# Altium footprint library main.PcbLib: 208 footprints (part 3 of 13)
Each footprint in its own frame and in the unit in brackets; x right, y up, seen from the top. Pads: shape width x height; smd on the part's side, far side on the other; paste and mask are expansions set on the pad; w line width, h text height; cw(c..) or ccw(c..) is an arc to the next point about the centre after c.
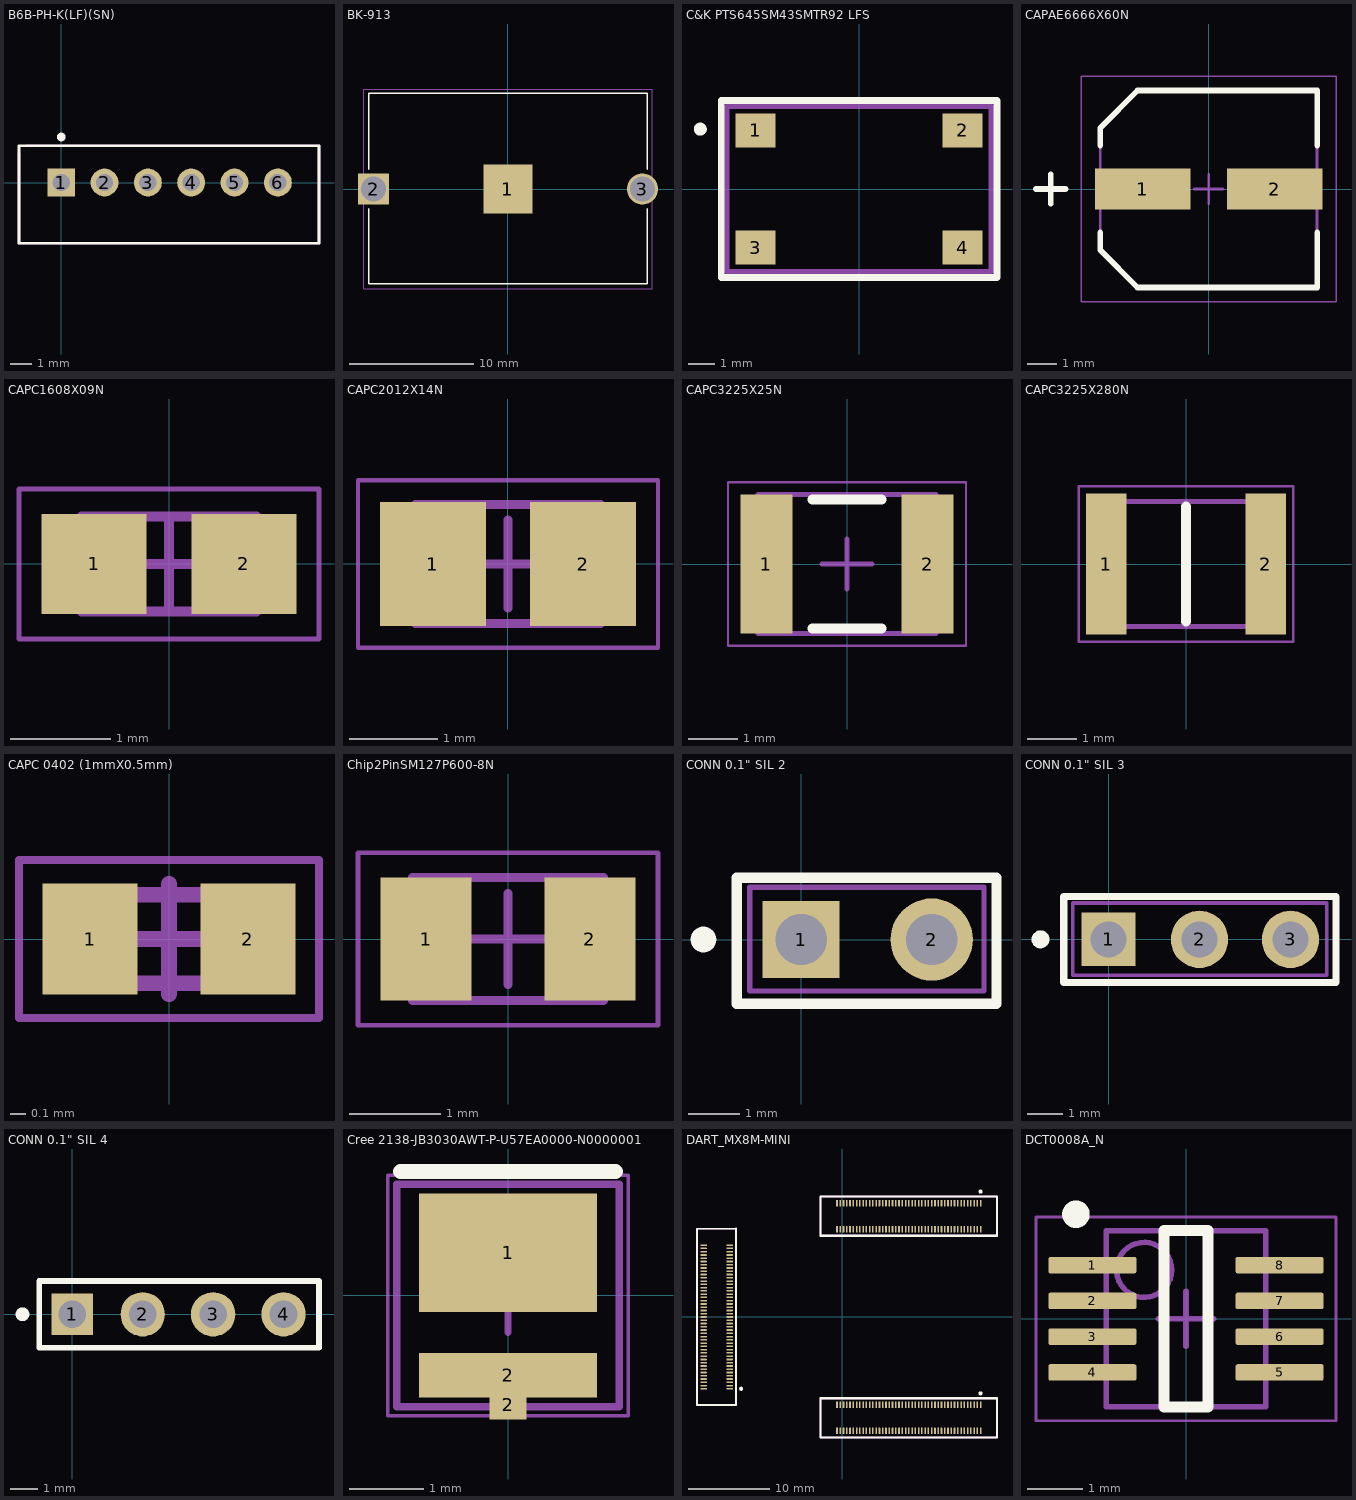
[diagram p2: the footprints below, top view; thin cyan lines are the x and y axes]

## B6B-PH-K(LF)(SN) [mm] "B6B-PH-K(LF)(SN)"
height 1.8
pads (6):
  rect 1.29x1.29 hole 0.8: 1(0,0)
  round 1.29 hole 0.8: 2(2,0) 3(4,0) 4(6,0) 5(8,0) 6(10,0)
Top Overlay:
  circle w0.2: c0,2.1 r0.1
  lines w0.127: -1.95,-2.8 -1.95,1.7 11.9,1.7 11.9,-2.8 -1.95,-2.8
Mechanical 7:
  text ".Designator" at -1.2,-3.9 h1.52
Mechanical 15:
  lines w0.127: -1.95,1.35 -1.95,-2.8 11.9,-2.8 11.9,1.25 ; -1.6,1.7 11.9,1.7 11.9,0
3D body "B6B-PH-K-S.STEP": height 6, standoff -3.4, extent -1.95,-2.8 11.95,1.7

## BK-913 [mm] "BK-913"
pads (3):
  rect 3.96x3.96 smd: 1(0,0)
  rect 2.5x2.5 hole 2: 2(-10.8,0)
  round 2.5 hole 2: 3(10.8,0)
Top Overlay:
  lines w0.127: -11.2,-1.6 -11.2,-7.6 11.2,-7.6 11.2,-1.6 ; -11.2,1.6 -11.2,7.7 11.2,7.7 11.2,1.6
Mechanical 7:
  text ".Designator" at -2,-4 h0.76
Mechanical 15:
  lines w0.05: -11.6,-8 11.6,-8 11.6,8 -11.6,8 -11.6,-8
3D body "BK-913.STEP": height 5.06, standoff -2, extent -11.175,-7.62 11.175,7.671

## C&K PTS645SM43SMTR92 LFS [mm] "SWITCH TACTILE SPST-NO 0.05A 12V"
height 4.4
pads (4):
  rect 1.55x1.3 smd: 1(-3.975,2.25) 2(3.975,2.25) 3(-3.975,-2.25) 4(3.975,-2.25)
Top Overlay:
  circle w0.25: c-6.1,2.3 r0.125
  lines w0.254: -5.3,-3.4 5.3,-3.4 5.3,3.4 -5.3,3.4 -5.3,-3.4
Mechanical 7:
  text ".Designator" at -4.262,-1.046 h1.52
Mechanical 15:
  lines w0.2: -5.08,-3.175 -5.08,3.175 5.08,3.175 5.08,-3.175 -5.08,-3.175
3D body "97m01645fp.stp": height 4.3, standoff 0, extent -4.5,-3 4.5,3

## CAPAE6666X60N [mm] "Aluminum Electrolytic Capacitor, Body 7.30x6.60x6.00mm, IPC Medium Density"
height 6
pads (2):
  rect 3.3x1.4 smd: 1(-2.275,0) 2(2.275,0)
Top Overlay:
  lines w0.2: -5.969,0 -4.953,0 ; -5.461,-0.508 -5.461,0.508 ; -3.75,-1.5 -3.75,-2.113 -2.462,-3.4 3.75,-3.4 3.75,-1.5 ; -3.75,1.5 -3.75,2.113 -2.462,3.4 3.75,3.4 3.75,1.5
Mechanical 7:
  text ".Designator" at -3.81,-0.889 h1.52
Mechanical 13:
  lines w0.1: -3.75,-2.113 -2.462,-3.4 3.75,-3.4 3.75,3.4 -2.462,3.4 -3.75,2.113 -3.75,-2.113
Mechanical 15:
  lines w0.05: -4.4,-3.9 -4.4,3.9 4.4,3.9 4.4,-3.9 -4.4,-3.9
  lines w0.1: -0.5,0 0.5,0 ; 0,-0.5 0,0.5
3D body: height 2, standoff 0, extent -3.75,-3.4 3.75,3.4
3D body: height 6, standoff 0, extent -3.4,-3.4 3.4,3.4

## CAPC1608X09N [mm] "Chip Capacitor, 2-Leads, Body 1.60x0.80mm, IPC Medium Density"
height 0.92
pads (2):
  rect 1.05x1 smd: 1(-0.75,0) 2(0.75,0)
Mechanical 7:
  text ".Designator" at -0.762,-0.254 h0.76
Mechanical 13:
  lines w0.1: -0.875,-0.475 -0.875,0.475 0.875,0.475 0.875,-0.475 -0.875,-0.475
Mechanical 15:
  lines w0.05: -1.5,-0.75 -1.5,0.75 1.5,0.75 1.5,-0.75 -1.5,-0.75
  lines w0.1: -0.475,0 0.475,0 ; 0,-0.475 0,0.475
3D body "CAPC1608X09N.step": height 0.92, standoff 0, extent -0.875,-0.475 0.875,0.475

## CAPC2012X14N [mm] "Chip Capacitor, 2-Leads, Body 2.00x1.25mm, IPC Medium Density"
height 1.35
pads (2):
  rect 1.2x1.4 smd: 1(-0.85,0) 2(0.85,0)
Mechanical 7:
  text ".Designator" at -0.889,-0.381 h0.76
Mechanical 13:
  lines w0.1: -1.05,-0.675 -1.05,0.675 1.05,0.675 1.05,-0.675 -1.05,-0.675
Mechanical 15:
  lines w0.05: -1.7,-0.95 -1.7,0.95 1.7,0.95 1.7,-0.95 -1.7,-0.95
  lines w0.1: -0.5,0 0.5,0 ; 0,-0.5 0,0.5
3D body: height 1.35, standoff 0, extent -0.6,-0.675 0.6,0.675
3D body: height 1.35, standoff 0, extent -1.05,-0.675 -0.6,0.675
3D body: height 1.35, standoff 0, extent 0.6,-0.675 1.05,0.675

## CAPC3225X25N [mm] "Chip Capacitor, 2-Leads, Body 3.20x2.50mm, IPC Medium Density"
height 2.5
pads (2):
  rect 1.05x2.8 smd: 1(-1.625,0) 2(1.625,0)
Top Overlay:
  lines w0.2: -0.7,-1.3 0.7,-1.3 ; -0.7,1.3 0.7,1.3
Mechanical 7:
  text ".Designator" at -1.739,-0.285 h0.76
Mechanical 13:
  lines w0.1: -1.8,-1.4 1.8,-1.4 1.8,1.4 -1.8,1.4 -1.8,-1.4
Mechanical 15:
  lines w0.05: -2.4,-1.65 2.4,-1.65 2.4,1.65 -2.4,1.65 -2.4,-1.65
  lines w0.1: -0.5,0 0.5,0 ; 0,-0.5 0,0.5
3D body: height 2.5, standoff 0, extent 1.55,-1.4 1.8,1.4
3D body: height 2.5, standoff 0, extent -1.8,-1.4 -1.55,1.4
3D body: height 2.5, standoff 0, extent -1.55,-1.4 1.55,1.4

## CAPC3225X280N [mm]
pads (2):
  rect 0.81x2.82 smd: 1(-1.6,0) 2(1.6,0)
Top Overlay:
  lines w0.2: 0,-1.15 0,1.15
Mechanical 13:
  lines w0.1: -1.6,-1.25 -1.6,1.25 1.6,1.25 1.6,-1.25 -1.6,-1.25
Mechanical 15:
  lines w0.05: -2.155,-1.56 -2.155,1.56 2.155,1.56 2.155,-1.56 -2.155,-1.56
3D body "CGA6P3X7R1H335K250AB.stp": height 2.77, standoff 0.03, extent -1.4,-1.225 1.4,1.225

## CAPC 0402 (1mmX0.5mm) [mm] "CAPC 0402 (1mmX0.5mm)"
height 0.5
pads (2):
  rect 0.6x0.7 smd: 1(-0.5,0) 2(0.5,0)
Mechanical 7:
  text ".Designator" at -0.762,-0.254 h0.76
Mechanical 13:
  lines w0.1: -0.53,-0.28 0.53,-0.28 0.53,0.28 -0.53,0.28 -0.53,-0.28
Mechanical 15:
  lines w0.05: -0.95,-0.5 0.95,-0.5 0.95,0.5 -0.95,0.5 -0.95,-0.5
  lines w0.1: -0.35,0 0.35,0 ; 0,-0.35 0,0.35
3D body "User Library-cap_0402.STEP": height 0.5, standoff 0, extent -0.5,-0.25 0.5,0.25

## Chip2PinSM127P600-8N [mm]
height 0.6
pads (2):
  rect 1x1.35 smd: 1(-0.9,0) 2(0.9,0)
Mechanical 7:
  text ".Designator" at -1.17,-0.385 h0.76
Mechanical 13:
  lines w0.1: -1.05,-0.675 -1.05,0.675 1.05,0.675 1.05,-0.675 -1.05,-0.675
Mechanical 15:
  lines w0.05: -1.65,-0.95 -1.65,0.95 1.65,0.95 1.65,-0.95 -1.65,-0.95
  lines w0.1: -0.5,0 0.5,0 ; 0,-0.5 0,0.5
3D body: height 0.6, standoff 0, extent -0.7,-0.675 0.7,0.675
3D body: height 0.6, standoff 0, extent -1.05,-0.675 -0.7,0.675
3D body: height 0.6, standoff 0, extent 0.7,-0.675 1.05,0.675

## CONN 0.1" SIL 2 [mm]
height 1.8
pads (2):
  rect 1.5x1.5 hole 1: 1(0,0)
  round 1.6 hole 1: 2(2.54,0)
Top Overlay:
  circle w0.25: c-1.9,0 r0.125
  lines w0.2: -1.25,-1.25 3.8,-1.25 3.8,1.2 -1.25,1.2 -1.25,-1.25
Mechanical 7:
  text ".Designator" at -0.889,-0.762 h1.52
Mechanical 13:
  lines w0.1: -1,-1 3.556,-1 3.556,1.016 -1,1.016 -1,-1
Mechanical 15:
  lines w0.05: -0.5,0 0.5,0 ; 0,-0.5 0,0.5 ; -1.25,-1.25 3.81,-1.25 3.81,1.27 -1.25,1.27 -1.25,-1.25
3D body "User Library-Header1x2.STEP": height 8.79, standoff -2.19, extent -1.27,-1.27 3.81,1.27

## CONN 0.1" SIL 3 [mm]
height 0.025
pads (3):
  rect 1.5x1.5 hole 1: 1(0,0)
  round 1.6 hole 1: 2(2.54,0) 3(5.08,0)
Top Overlay:
  circle w0.25: c-1.9,0 r0.125
  lines w0.2: -1.25,-1.2 6.35,-1.2 6.35,1.2 -1.25,1.2 -1.25,-1.2
Mechanical 7:
  text ".Designator" at 0.254,-0.635 h1.52
Mechanical 13:
  lines w0.1: -1,-1 6.096,-1 6.096,1.016 -1,1.016 -1,-1
Mechanical 15:
  lines w0.05: -0.5,0 0.5,0 ; 0,-0.5 0,0.5 ; -1.25,-1.25 6.35,-1.25 6.35,1.27 -1.25,1.27 -1.25,-1.25
3D body "User Library-Header_Male_3Pin.STEP": height 8.54, standoff -3, extent -1.27,-1.245 6.35,1.245

## CONN 0.1" SIL 4 [mm]
height 0.025
pads (4):
  rect 1.5x1.5 hole 1: 1(0,0)
  round 1.6 hole 1: 2(2.54,0) 3(5.08,0) 4(7.62,0)
Top Overlay:
  circle w0.25: c-1.8,0 r0.125
  lines w0.2: -1.2,-1.2 -1.2,1.2 8.9,1.2 8.9,-1.2 -1.2,-1.2
Mechanical 7:
  text ".Designator" at 1.016,-0.635 h1.52
Mechanical 15:
  lines w0.05: -0.5,0 0.5,0 ; 0,-0.5 0,0.5 ; -1.25,-1.25 -1.25,1.27 8.89,1.27 8.89,-1.25 -1.25,-1.25
3D body "65781.stp": height 8.08, standoff -3.46, extent -1.27,-1.27 8.89,1.27

## Cree 2138-JB3030AWT-P-U57EA0000-N0000001 [mm] "Cree 2138-JB3030AWT-P-U57EA0000-N0000001"
height 0.72
pads (3):
  rect 2.4x1.6 smd: 1(0,0.575)
  rect 0.5x0.4 smd: 2(0,-1.475)
  rect 2.4x0.6 smd: 2(0,-1.075)
Top Overlay:
  lines w0.2: -1.45,1.675 1.45,1.675
Mechanical 7:
  text ".Designator" at -1.25,-0.45 h0.76
Mechanical 13:
  lines w0.1: -1.5,-1.5 -1.5,1.5 1.5,1.5 1.5,-1.5 -1.5,-1.5
Mechanical 15:
  lines w0.05: -1.625,-1.625 -1.625,1.625 1.625,1.625 1.625,-1.625 -1.625,-1.625
  lines w0.1: -0.5,0 0.5,0 ; 0,-0.5 0,0.5
3D body: height 0.52, standoff 0, extent -1.5,-1.5 1.5,1.5

## DART_MX8M-MINI [mm] "DART_MX8M-MINI"
pads (270):
  rect 0.2x0.8 smd: J1-1(16.975,13.95) J2-1(16.975,-10.75)
  rrect50% 0.2x0.8 smd: J1-2(16.975,10.75) J1-3(16.575,13.95) J1-4(16.575,10.75) J1-5(16.175,13.95) J1-6(16.175,10.75) J1-7(15.775,13.95) J1-8(15.775,10.75) J1-9(15.375,13.95) J1-10(15.375,10.75) J1-11(14.975,13.95) J1-12(14.975,10.75) J1-13(14.575,13.95) J1-14(14.575,10.75) J1-15(14.175,13.95) J1-16(14.175,10.75) J1-17(13.775,13.95) J1-18(13.775,10.75) J1-19(13.375,13.95) J1-20(13.375,10.75) J1-21(12.975,13.95) J1-22(12.975,10.75) J1-23(12.575,13.95) J1-24(12.575,10.75) J1-25(12.175,13.95) J1-26(12.175,10.75) J1-27(11.775,13.95) J1-28(11.775,10.75) J1-29(11.375,13.95) J1-30(11.375,10.75) J1-31(10.975,13.95) J1-32(10.975,10.75) J1-33(10.575,13.95) J1-34(10.575,10.75) J1-35(10.175,13.95) J1-36(10.175,10.75) J1-37(9.775,13.95) J1-38(9.775,10.75) J1-39(9.375,13.95) J1-40(9.375,10.75) J1-41(8.975,13.95) J1-42(8.975,10.75) J1-43(8.575,13.95) J1-44(8.575,10.75) J1-45(8.175,13.95) J1-46(8.175,10.75) J1-47(7.775,13.95) J1-48(7.775,10.75) J1-49(7.375,13.95) J1-50(7.375,10.75) J1-51(6.975,13.95) J1-52(6.975,10.75) J1-53(6.575,13.95) J1-54(6.575,10.75) J1-55(6.175,13.95) J1-56(6.175,10.75) J1-57(5.775,13.95) J1-58(5.775,10.75) J1-59(5.375,13.95) J1-60(5.375,10.75) J1-61(4.975,13.95) J1-62(4.975,10.75) J1-63(4.575,13.95) J1-64(4.575,10.75) J1-65(4.175,13.95) J1-66(4.175,10.75) J1-67(3.775,13.95) J1-68(3.775,10.75) J1-69(3.375,13.95) J1-70(3.375,10.75) J1-71(2.975,13.95) J1-72(2.975,10.75) J1-73(2.575,13.95) J1-74(2.575,10.75) J1-75(2.175,13.95) J1-76(2.175,10.75) J1-77(1.775,13.95) J1-78(1.775,10.75) J1-79(1.375,13.95) J1-80(1.375,10.75) J1-81(0.975,13.95) J1-82(0.975,10.75) J1-83(0.575,13.95) J1-84(0.575,10.75) J1-85(0.175,13.95) J1-86(0.175,10.75) J1-87(-0.225,13.95) J1-88(-0.225,10.75) J1-89(-0.625,13.95) J1-90(-0.625,10.75) J2-2(16.975,-13.95) J2-3(16.575,-10.75) J2-4(16.575,-13.95) J2-5(16.175,-10.75) J2-6(16.175,-13.95) J2-7(15.775,-10.75) J2-8(15.775,-13.95) J2-9(15.375,-10.75) J2-10(15.375,-13.95) J2-11(14.975,-10.75) J2-12(14.975,-13.95) J2-13(14.575,-10.75) J2-14(14.575,-13.95) J2-15(14.175,-10.75) J2-16(14.175,-13.95) J2-17(13.775,-10.75) J2-18(13.775,-13.95) J2-19(13.375,-10.75) J2-20(13.375,-13.95) J2-21(12.975,-10.75) J2-22(12.975,-13.95) J2-23(12.575,-10.75) J2-24(12.575,-13.95) J2-25(12.175,-10.75) J2-26(12.175,-13.95) J2-27(11.775,-10.75) J2-28(11.775,-13.95) J2-29(11.375,-10.75) J2-30(11.375,-13.95) J2-31(10.975,-10.75) J2-32(10.975,-13.95) J2-33(10.575,-10.75) J2-34(10.575,-13.95) J2-35(10.175,-10.75) J2-36(10.175,-13.95) J2-37(9.775,-10.75) J2-38(9.775,-13.95) J2-39(9.375,-10.75) J2-40(9.375,-13.95) J2-41(8.975,-10.75) J2-42(8.975,-13.95) J2-43(8.575,-10.75) J2-44(8.575,-13.95) J2-45(8.175,-10.75) J2-46(8.175,-13.95) J2-47(7.775,-10.75) J2-48(7.775,-13.95) J2-49(7.375,-10.75) J2-50(7.375,-13.95) J2-51(6.975,-10.75) J2-52(6.975,-13.95) J2-53(6.575,-10.75) J2-54(6.575,-13.95) J2-55(6.175,-10.75) J2-56(6.175,-13.95) J2-57(5.775,-10.75) J2-58(5.775,-13.95) J2-59(5.375,-10.75) J2-60(5.375,-13.95) J2-61(4.975,-10.75) J2-62(4.975,-13.95) J2-63(4.575,-10.75) J2-64(4.575,-13.95) J2-65(4.175,-10.75) J2-66(4.175,-13.95) J2-67(3.775,-10.75) J2-68(3.775,-13.95) J2-69(3.375,-10.75) J2-70(3.375,-13.95) J2-71(2.975,-10.75) J2-72(2.975,-13.95) J2-73(2.575,-10.75) J2-74(2.575,-13.95) J2-75(2.175,-10.75) J2-76(2.175,-13.95) J2-77(1.775,-10.75) J2-78(1.775,-13.95) J2-79(1.375,-10.75) J2-80(1.375,-13.95) J2-81(0.975,-10.75) J2-82(0.975,-13.95) J2-83(0.575,-10.75) J2-84(0.575,-13.95) J2-85(0.175,-10.75) J2-86(0.175,-13.95) J2-87(-0.225,-10.75) J2-88(-0.225,-13.95) J2-89(-0.625,-10.75) J2-90(-0.625,-13.95)
  rect 0.8x0.2 smd: J3-1(-13.775,-8.8)
  rrect50% 0.8x0.2 smd: J3-2(-16.975,-8.8) J3-3(-13.775,-8.4) J3-4(-16.975,-8.4) J3-5(-13.775,-8) J3-6(-16.975,-8) J3-7(-13.775,-7.6) J3-8(-16.975,-7.6) J3-9(-13.775,-7.2) J3-10(-16.975,-7.2) J3-11(-13.775,-6.8) J3-12(-16.975,-6.8) J3-13(-13.775,-6.4) J3-14(-16.975,-6.4) J3-15(-13.775,-6) J3-16(-16.975,-6) J3-17(-13.775,-5.6) J3-18(-16.975,-5.6) J3-19(-13.775,-5.2) J3-20(-16.975,-5.2) J3-21(-13.775,-4.8) J3-22(-16.975,-4.8) J3-23(-13.775,-4.4) J3-24(-16.975,-4.4) J3-25(-13.775,-4) J3-26(-16.975,-4) J3-27(-13.775,-3.6) J3-28(-16.975,-3.6) J3-29(-13.775,-3.2) J3-30(-16.975,-3.2) J3-31(-13.775,-2.8) J3-32(-16.975,-2.8) J3-33(-13.775,-2.4) J3-34(-16.975,-2.4) J3-35(-13.775,-2) J3-36(-16.975,-2) J3-37(-13.775,-1.6) J3-38(-16.975,-1.6) J3-39(-13.775,-1.2) J3-40(-16.975,-1.2) J3-41(-13.775,-0.8) J3-42(-16.975,-0.8) J3-43(-13.775,-0.4) J3-44(-16.975,-0.4) J3-45(-13.775,0) J3-46(-16.975,0) J3-47(-13.775,0.4) J3-48(-16.975,0.4) J3-49(-13.775,0.8) J3-50(-16.975,0.8) J3-51(-13.775,1.2) J3-52(-16.975,1.2) J3-53(-13.775,1.6) J3-54(-16.975,1.6) J3-55(-13.775,2) J3-56(-16.975,2) J3-57(-13.775,2.4) J3-58(-16.975,2.4) J3-59(-13.775,2.8) J3-60(-16.975,2.8) J3-61(-13.775,3.2) J3-62(-16.975,3.2) J3-63(-13.775,3.6) J3-64(-16.975,3.6) J3-65(-13.775,4) J3-66(-16.975,4) J3-67(-13.775,4.4) J3-68(-16.975,4.4) J3-69(-13.775,4.8) J3-70(-16.975,4.8) J3-71(-13.775,5.2) J3-72(-16.975,5.2) J3-73(-13.775,5.6) J3-74(-16.975,5.6) J3-75(-13.775,6) J3-76(-16.975,6) J3-77(-13.775,6.4) J3-78(-16.975,6.4) J3-79(-13.775,6.8) J3-80(-16.975,6.8) J3-81(-13.775,7.2) J3-82(-16.975,7.2) J3-83(-13.775,7.6) J3-84(-16.975,7.6) J3-85(-13.775,8) J3-86(-16.975,8) J3-87(-13.775,8.4) J3-88(-16.975,8.4) J3-89(-13.775,8.8) J3-90(-16.975,8.8)
Top Overlay:
  circle w0.25: c16.965,-9.35 r0.125
  circle w0.25: c-12.365,-8.79 r0.125
  circle w0.25: c16.965,15.36 r0.125
  lines w0.254: -17.775,-10.8 -12.975,-10.8 -12.975,10.826 -17.775,10.781 -17.775,-10.8 ; -2.625,-14.75 -2.625,-9.95 18.975,-9.95 18.975,-14.75 -2.625,-14.75 ; -2.625,9.95 -2.625,14.75 18.975,14.75 18.975,9.95 -2.625,9.95
Mechanical 7:
  text ".Designator" at 0.515,-13.58 h1.52
  text ".Designator" at -16.055,7.66 h1.52
  text ".Designator" at 0.515,11.67 h1.52
Mechanical 15:
  lines w0.254: -2.651,14.75 18.975,14.75 18.975,9.95 -2.606,9.95 ; -2.625,9.95 -2.625,14.75 ; -17.775,-10.8 -17.775,10.781 -12.975,10.826 -12.975,-10.8 -17.775,-10.8 ; -2.625,-14.75 -2.625,-9.95 18.975,-9.95 18.975,-14.75 -2.625,-14.75
3D body "DF40C-90DS.stp": height 1.4, standoff -0.05, extent -2.125,-14.04 18.475,-10.66
3D body "DF40C-90DS.stp": height 1.4, standoff -0.05, extent -17.065,-10.3 -13.685,10.3
3D body "DF40C-90DS.stp": height 1.4, standoff -0.05, extent -2.125,10.66 18.475,14.04
3D body "DART-MX8M-MINI.STEP": height 5.43, standoff 1.2, extent -18.114,-15.05 37.065,15.062

## DCT0008A_N [mm] "SOP, 8-Leads, Body 2.9x3.2mm, Pitch 0.65mm, IPC Medium Density"
height 1.3
pads (8):
  rrect25% 1.6x0.3 smd: 1(-1.7,0.975) 2(-1.7,0.325) 3(-1.7,-0.325) 4(-1.7,-0.975) 5(1.7,-0.975) 6(1.7,-0.325) 7(1.7,0.325) 8(1.7,0.975)
Top Overlay:
  circle w0.25: c-2,1.9 r0.125
  lines w0.2: -0.4,-1.6 0.4,-1.6 0.4,1.6 -0.4,1.6 -0.4,-1.6
Mechanical 7:
  text ".Designator" at -2.159,-1.143 h1.52
Mechanical 13:
  circle w0.1: c-0.762,0.889 r0.5
  lines w0.1: -1.45,-1.6 1.45,-1.6 1.45,1.6 -1.45,1.6 -1.45,-1.6
Mechanical 15:
  lines w0.05: -2.725,-1.85 2.725,-1.85 2.725,1.85 -2.725,1.85 -2.725,-1.85
  lines w0.1: -0.5,0 0.5,0 ; 0,-0.5 0,0.5
3D body "DCT0008A.stp": height 1.3, standoff 0, extent -2.011,-1.475 2.011,1.475